# Altium footprint library std-smt.PcbLib: 117 footprints (part 2 of 8)
Each footprint in its own frame and in the unit in brackets; x right, y up, seen from the top. Pads: shape width x height; smd on the part's side, far side on the other; paste and mask are expansions set on the pad; w line width, h text height; cw(c..) or ccw(c..) is an arc to the next point about the centre after c.
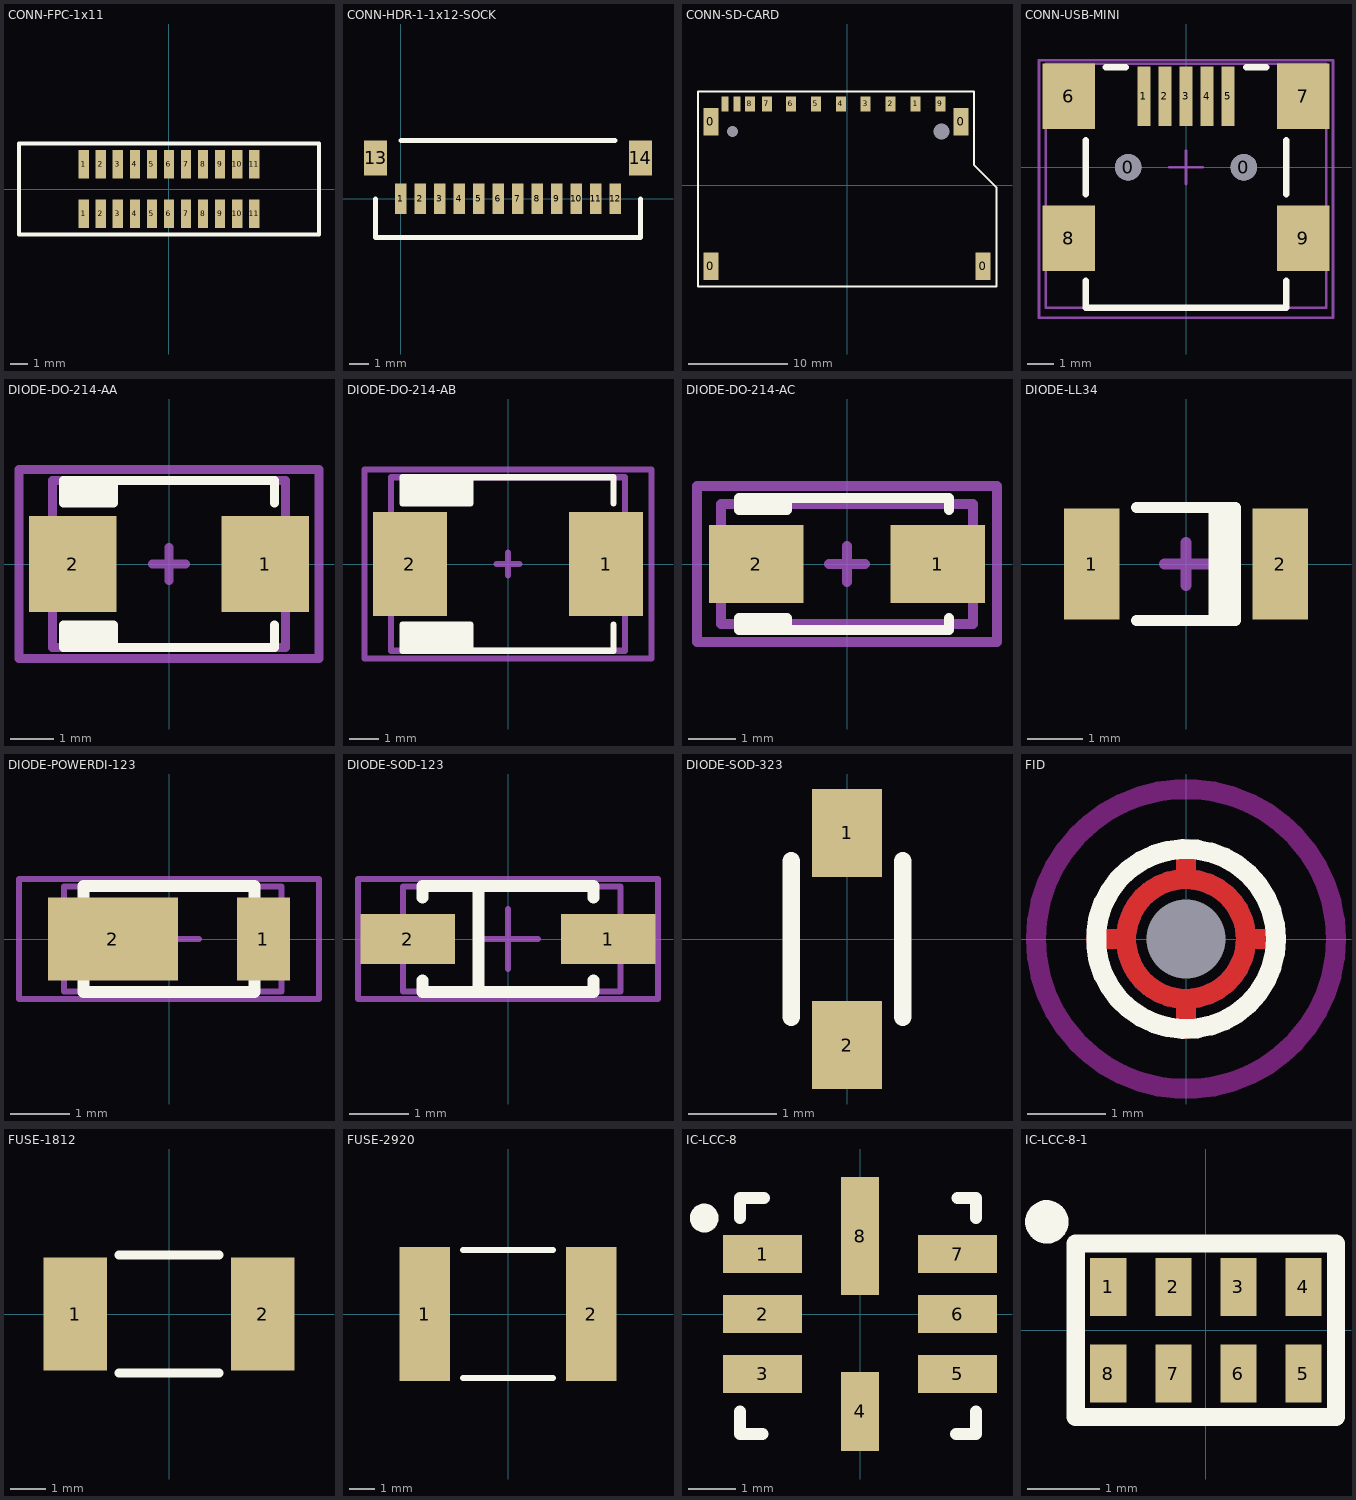
[diagram p1: the footprints below, top view; thin cyan lines are the x and y axes]

## CONN-FPC-1x11 [mm] "FPC SMD 11 way 1 mm pitch"
height 5
pads (22):
  rect 0.6x1.65 smd: 1(-5,-1.45) 1(-5,1.45) 2(-4,-1.45) 2(-4,1.45) 3(-3,-1.45) 3(-3,1.45) 4(-2,-1.45) 4(-2,1.45) 5(-1,-1.45) 5(-1,1.45) 6(0,-1.45) 6(0,1.45) 7(1,-1.45) 7(1,1.45) 8(2,-1.45) 8(2,1.45) 9(3,-1.45) 9(3,1.45) 10(4,-1.45) 10(4,1.45) 11(5,-1.45) 11(5,1.45)
Top Overlay:
  lines w0.254: -8.8,-2.667 8.8,-2.667 8.8,2.667 -8.8,2.667 -8.8,-2.667
3D body: height 7.25, standoff -0.05, extent -8.8,-2.25 8.8,2.25

## CONN-HDR-1-1x12-SOCK [mm] "Connector, 12 way, 1 mm pitch, JST no. BM12B-SRSS-TB"
height 2
pads (14):
  rect 0.6x1.55 smd: 1(0,0) 2(1,0) 3(2,0) 4(3,0) 5(4,0) 6(5,0) 7(6,0) 8(7,0) 9(8,0) 10(9,0) 11(10,0) 12(11,0)
  rect 1.2x1.8 smd: 13(-1.3,2.1) 14(12.3,2.1)
Top Overlay:
  lines w0.254: -1.3,0 -1.3,-2 12.3,-2 12.3,0 ; 0,3 11,3

## CONN-SD-CARD [mm] "SD Card Holder"
height 1.5
pads (17):
  rect 1.5x2.8 smd: 0(-13.65,-8.15) 0(-13.65,6.35) 0(11.45,6.35) 0(13.65,-8.15)
  rect 0x0 hole 1.6 unplated: 0(9.5,5.35)
  rect 0x0 hole 1.1 unplated: 1(-11.5,5.35)
  rect 1x1.5 smd: 1(6.875,8.15) 2(4.375,8.15) 3(1.875,8.15) 4(-0.625,8.15) 5(-3.125,8.15) 6(-5.625,8.15) 7(-8.05,8.15) 8(-9.75,8.15) 9(9.375,8.15)
  rect 0.7x1.5 smd: 10(-11.05,8.15) 11(-12.25,8.15)
Top Overlay:
  lines w0.203: -14.962,-10.178 -14.962,9.38 12.724,9.38 12.724,2.014 15.01,-0.272 15.01,-10.178 -14.962,-10.178
3D body: height 2.75, standoff -0.8, extent -14.4,-9.55 14.4,8.9

## CONN-USB-MINI [mm] "Connector, USB, B type, Mini"
height 2
pads (11):
  round 1 hole 1: 0(-2.2,0)
  round 1 hole 1 unplated: 0(2.2,0)
  rect 0.5x2.25 smd: 1(-1.6,2.7) 2(-0.8,2.7) 3(0,2.7) 4(0.8,2.7) 5(1.6,2.7)
  rect 2x2.5 smd: 6(-4.45,2.7) 7(4.45,2.7) 8(-4.45,-2.7) 9(4.45,-2.7)
Top Overlay:
  lines w0.254: -3.81,-4.318 -3.81,-5.334 3.81,-5.334 3.81,-4.318 ; -3.81,-1.016 -3.81,1.016 ; -3.048,3.8 -2.286,3.8 ; 2.286,3.8 3.048,3.8 ; 3.81,-1.016 3.81,1.016
Mechanical 13:
  lines w0.1: -5.334,-5.334 5.334,-5.334 5.334,3.937 -5.334,3.937 -5.334,-5.334
Mechanical 15:
  lines w0.1: -0.635,0 0.635,0 ; 0,-0.635 0,0.635 ; -5.588,-5.715 5.588,-5.715 5.588,4.064 -5.588,4.064 -5.588,-5.715
3D body: height 3.95, standoff -1, extent -5.35,-5.265 5.35,3.935

## DIODE-DO-214-AA [mm] "Diode, DO-214-AA, SMB"
height 2
pads (2):
  rect 2x2.2 smd: 1(2.2,0) 2(-2.2,0)
Top Overlay:
  rectangle: -2.413,1.397 -1.27,1.905
  rectangle: -2.413,-1.905 -1.27,-1.397
  lines w0.203: -1.27,-1.905 -1.27,-1.397 -2.413,-1.397 -2.413,-1.905 2.413,-1.905 2.413,-1.397 ; -1.27,1.905 -1.27,1.397 -2.413,1.397 -2.413,1.905 2.413,1.905 2.413,1.397
Mechanical 13:
  lines w0.203: -2.667,-1.905 -2.667,1.905 2.667,1.905 2.667,-1.905 -2.667,-1.905
Mechanical 15:
  lines w0.203: -0.381,0 0.381,0 ; 0,-0.381 0,0.381 ; -3.429,-2.159 -3.429,2.159 3.429,2.159 3.429,-2.159 -3.429,-2.159
3D body: height 2.25, standoff 0, extent -2.65,-1.85 2.65,1.85

## DIODE-DO-214-AB [mm] "Diode, DO-214-AB, SMC"
height 2
pads (2):
  rect 2.5x3.5 smd: 1(3.3,0) 2(-3.3,0)
Top Overlay:
  rectangle: -3.556,2.032 -1.27,2.921
  rectangle: -3.556,-2.921 -1.27,-2.032
  lines w0.203: -1.27,-2.921 -1.27,-2.032 -3.556,-2.032 -3.556,-2.921 3.556,-2.921 3.556,-2.032 ; -1.27,2.921 -1.27,2.032 -3.556,2.032 -3.556,2.921 3.556,2.921 3.556,2.032
Mechanical 13:
  lines w0.203: -3.937,-2.921 -3.937,2.921 3.937,2.921 3.937,-2.921 -3.937,-2.921
Mechanical 15:
  lines w0.203: -0.381,0 0.381,0 ; 0,-0.381 0,0.381 ; -4.826,-3.175 -4.826,3.175 4.826,3.175 4.826,-3.175 -4.826,-3.175
3D body: height 2.45, standoff 0, extent -3.9,-2.95 3.9,2.95

## DIODE-DO-214-AC [mm] "Diode, DO-214-AC, SMA"
height 2
pads (2):
  rect 2x1.65 smd: 1(1.925,0) 2(-1.925,0)
Top Overlay:
  rectangle: -2.286,-1.397 -1.27,-1.143
  rectangle: -2.286,1.143 -1.27,1.397
  lines w0.203: -1.27,-1.397 -1.27,-1.143 -2.286,-1.143 -2.286,-1.397 2.159,-1.397 2.159,-1.143 ; -1.27,1.397 -1.27,1.143 -2.286,1.143 -2.286,1.397 2.159,1.397 2.159,1.143
Mechanical 13:
  lines w0.203: -2.667,-1.27 2.667,-1.27 2.667,1.27 -2.667,1.27 -2.667,-1.27
Mechanical 15:
  lines w0.203: -0.381,0 0.381,0 ; 0,-0.381 0,0.381 ; -3.175,-1.651 3.175,-1.651 3.175,1.651 -3.175,1.651 -3.175,-1.651
3D body: height 2.2, standoff 0, extent -2.5,-1.35 2.5,1.35

## DIODE-LL34 [mm] "Diode, LL-34, 3.4 mm x 1.4 mm"
height 1.4
pads (2):
  rect 1x2 smd: 1(-1.7,0) 2(1.7,0)
Top Overlay:
  rectangle: 0.508,-1.016 0.889,1.016
  lines w0.203: -0.889,-1.016 0.889,-1.016 0.889,1.016 -0.889,1.016 ; 0.508,-1.016 0.508,1.016
Mechanical 15:
  lines w0.203: -0.381,0 0.381,0 ; 0,-0.381 0,0.381
3D body: height 1.4, standoff 0, extent -1.7,-0.7 1.7,0.7

## DIODE-POWERDI-123 [mm] "Diode; POWERDI-123; 2 Leads; Body 2.7 x 1.6 mm"
height 1.35
pads (2):
  rect 0.9x1.4 smd: 1(1.6,0)
  rect 2.2x1.4 smd: 2(-0.95,0)
Top Overlay:
  lines w0.2: -1.45,-0.7 -1.45,-0.9 1.45,-0.9 1.45,-0.7 ; -1.45,0.7 -1.45,0.9 1.45,0.9 1.45,0.7
Mechanical 13:
  lines w0.1: -1.778,-0.889 -1.778,0.889 1.905,0.889 1.905,-0.889 -1.778,-0.889
Mechanical 15:
  lines w0.1: -0.508,0 0.508,0 ; 0,-0.508 0,0.508 ; -2.54,-1.016 2.54,-1.016 2.54,1.016 -2.54,1.016 -2.54,-1.016
3D body: height 1.15, standoff 0, extent -1.95,-0.88 1.95,0.9

## DIODE-SOD-123 [mm] "Diode; SOD-123; 2 Leads; Body 2.7 x 1.6 mm"
height 1.35
pads (2):
  rect 1.6x0.85 smd: 1(1.7,0) 2(-1.7,0)
Top Overlay:
  lines w0.2: -1.45,-0.7 -1.45,-0.9 1.45,-0.9 1.45,-0.7 ; -1.45,0.7 -1.45,0.9 1.45,0.9 1.45,0.7 ; -0.5,-0.9 -0.5,0.9
Mechanical 13:
  lines w0.1: -1.778,-0.889 -1.778,0.889 1.905,0.889 1.905,-0.889 -1.778,-0.889
Mechanical 15:
  lines w0.1: -0.508,0 0.508,0 ; 0,-0.508 0,0.508 ; -2.54,-1.016 2.54,-1.016 2.54,1.016 -2.54,1.016 -2.54,-1.016
3D body: height 1.27, standoff 0, extent -1.778,-0.8 1.922,0.8

## DIODE-SOD-323 [mm] "SOD-323"
height 1.2
pads (2):
  rect 0.8x1 smd: 1(0,1.206) 2(0,-1.206)
Top Overlay:
  lines w0.203: -0.635,-0.889 -0.635,0.889 ; 0.635,-0.889 0.635,0.889
3D body: height 1.1, standoff 0, extent -0.675,-1.3 0.675,1.3

## FID [mm]
pads (1):
  round 0 hole 1 unplated: 0(0,0)
Top Layer:
  circle w0.254: c0,0 r0.762
  lines w0.254: -1.143,0 -0.762,0 ; 0,-1.143 0,-0.762 ; 0,0.762 0,1.143 ; 0.762,0 1.143,0
Bottom Layer:
  circle w0.254: c0,0 r0.762
  lines w0.254: -1.143,0 -0.762,0 ; 0,-1.143 0,-0.762 ; 0,0.762 0,1.143 ; 0.762,0 1.143,0
Top Overlay:
  circle w0.254: c0,0 r1.143
Bottom Overlay:
  circle w0.254: c0,0 r1.143
Top Paste:
  circle w0.254: c0,0 r0.762
Bottom Paste:
  circle w0.254: c0,0 r0.762
Top Solder:
  circle w0.254: c0,0 r1.524
  circle w0.254: c0,0 r0.762
  lines w0.254: -1.016,-1.016 -0.635,-0.635 ; -1.016,1.016 -0.635,0.635 ; 0.635,-0.635 1.016,-1.016 ; 0.635,0.635 1.016,1.016
Bottom Solder:
  circle w0.254: c0,0 r0.762
  circle w0.254: c0,0 r1.524
  lines w0.254: -1.016,-1.016 -0.635,-0.635 ; -1.016,1.016 -0.635,0.635 ; 0.635,-0.635 1.016,-1.016 ; 0.635,0.635 1.016,1.016
Keep-Out Layer:
  circle w0.254: c0,0 r1.905

## FUSE-1812 [mm] "Resettable fuse, 1812"
height 0.6
pads (2):
  rect 1.78x3.15 smd: 1(-2.615,0) 2(2.615,0)
Top Overlay:
  lines w0.254: -1.397,-1.651 1.397,-1.651 ; -1.397,1.651 1.397,1.651
3D body: height 1.32, standoff 0, extent -2.41,-1.61 2.41,1.61

## FUSE-2920 [mm] "Resettable fuse, 2920"
height 1.4
pads (2):
  rect 2x5.3 smd: 1(-3.3,0) 2(3.3,0)
Top Overlay:
  lines w0.254: -1.778,-2.54 1.778,-2.54 ; -1.778,2.54 1.778,2.54
3D body: height 1.4, standoff 0, extent -3.677,-2.56 3.678,2.56

## IC-LCC-8 [mm] "Footprint for the BMP085 barometer"
height 1
pads (8):
  rect 1.67x0.8 smd: 1(-2.065,1.27) 2(-2.065,0) 3(-2.065,-1.27) 5(2.065,-1.27) 6(2.065,0) 7(2.065,1.27)
  rect 0.8x1.67 smd: 4(0,-2.065)
  rect 0.8x2.5 smd: 8(0,1.65)
Top Overlay:
  circle w0.305: c-3.302,2.032 r0.152
  lines w0.254: -2.54,2.032 -2.54,2.46 -2.145,2.46 -2.032,2.46 ; 2.032,-2.54 2.46,-2.54 2.46,-2.065 ; 2.065,2.46 2.46,2.46 2.46,2.032 ; -2.54,-2.065 -2.54,-2.54 -2.065,-2.54 ; -2.54,-2.065 -2.54,-2.065 ; -2.065,-2.54 -2.065,-2.54
3D body: height 1.21, standoff 0, extent -2.54,-2.54 2.46,2.46

## IC-LCC-8-1 [mm] "LCC-8 footprint"
height 1
pads (8):
  rect 0.5x0.8 smd: 1(-1.35,0.6) 2(-0.45,0.6) 3(0.45,0.6) 4(1.35,0.6) 5(1.35,-0.6) 6(0.45,-0.6) 7(-0.45,-0.6) 8(-1.35,-0.6)
Top Overlay:
  circle w0.3: c-2.2,1.5 r0.15
  lines w0.254: -1.8,-1.2 -1.8,1.2 1.8,1.2 1.8,-1.2 -1.8,-1.2
3D body: height 0.8, standoff -0.01, extent -1.6,-0.75 1.6,0.75